# Altium footprint library Pcblib.PcbLib: 281 footprints (part 11 of 18)
Each footprint in its own frame and in the unit in brackets; x right, y up, seen from the top. Pads: shape width x height; smd on the part's side, far side on the other; paste and mask are expansions set on the pad; w line width, h text height; cw(c..) or ccw(c..) is an arc to the next point about the centre after c.
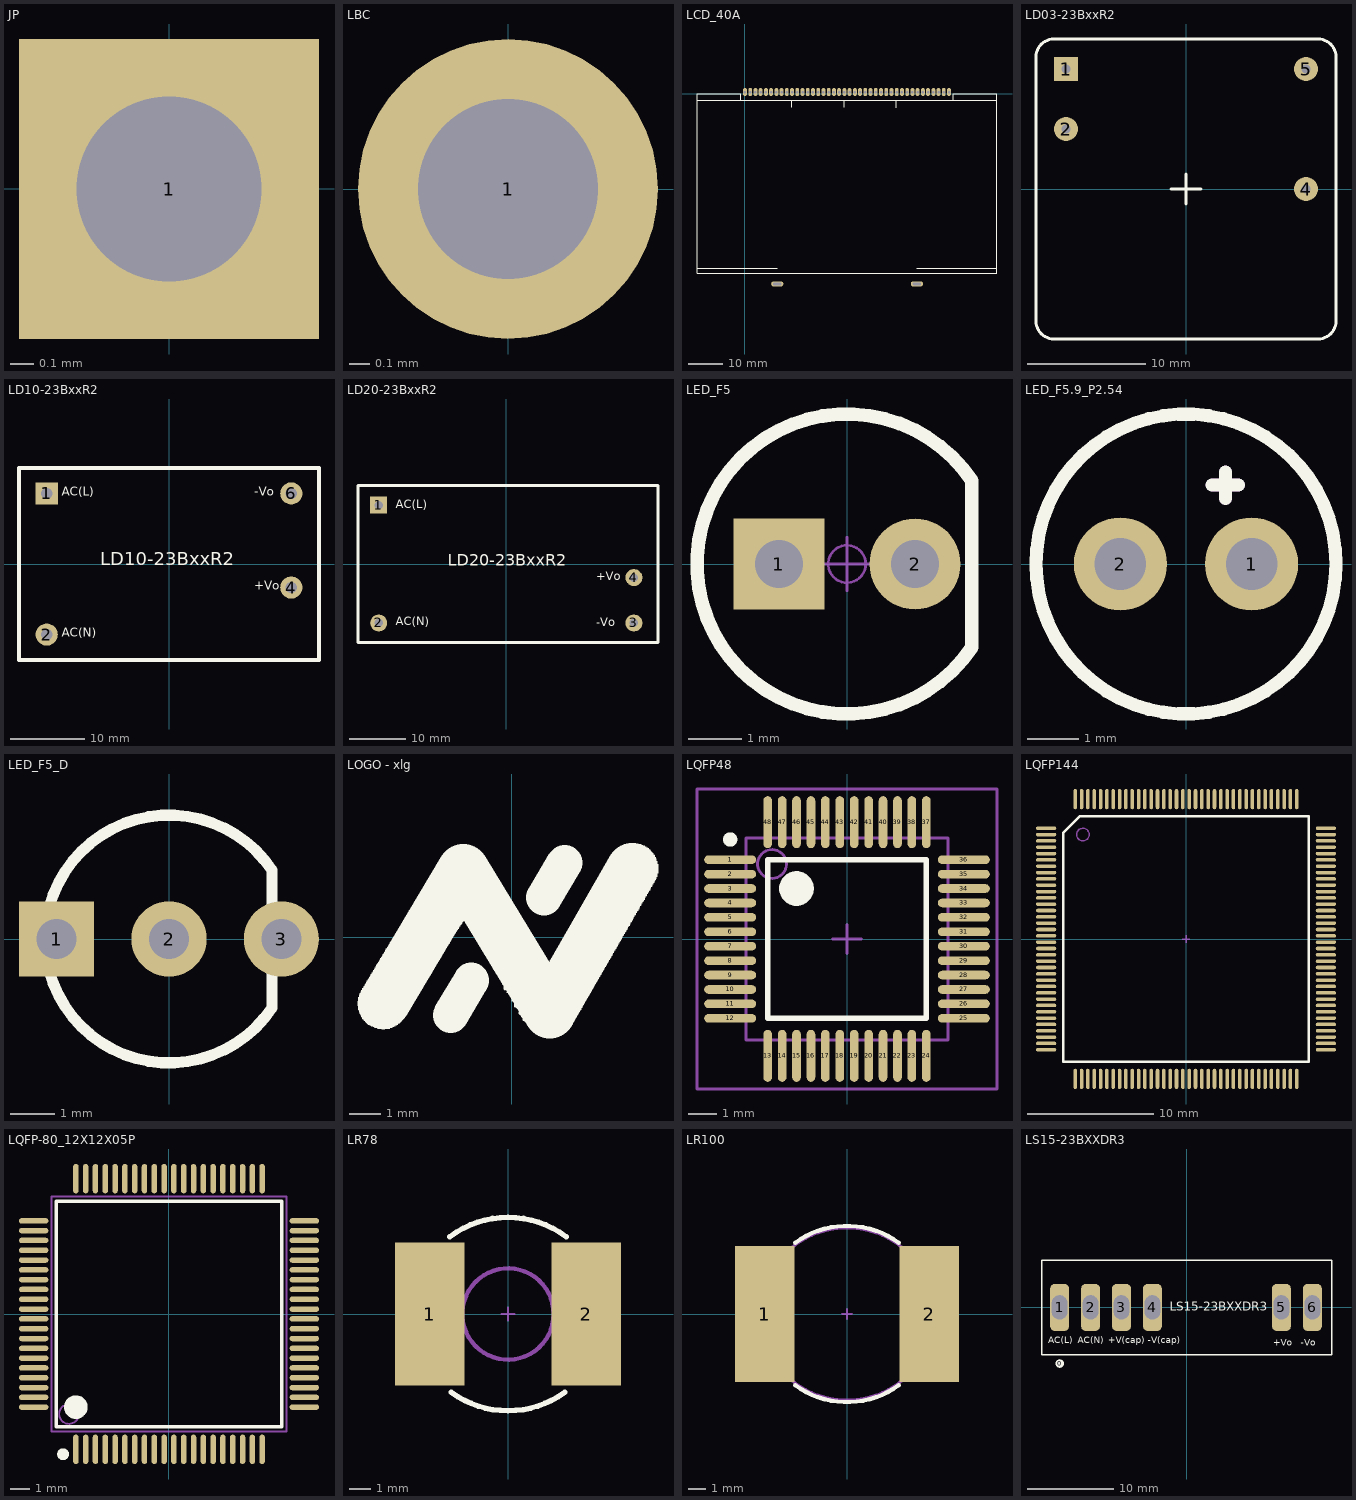
[diagram p10: the footprints below, top view; thin cyan lines are the x and y axes]

## JP [mm]
height 1.27
pads (1):
  rect 1.3x1.3 hole 0.8: 1(0,0)

## LBC [mm] "NMS"
pads (1):
  round 1.5 hole 0.9: 1(0,0)

## LCD_40A [mm]
height 5.6
pads (42):
  oval 1.1x2.3 hole 0.72: 1(0,0.5) 2(1.5,0.5) 3(3,0.5) 4(4.5,0.5) 5(6,0.5) 6(7.5,0.5) 7(9,0.5) 8(10.5,0.5) 9(12,0.5) 10(13.5,0.5) 11(15,0.5) 12(16.5,0.5) 13(18,0.5) 14(19.5,0.5) 15(21,0.5) 16(22.5,0.5) 17(24,0.5) 18(25.5,0.5) 19(27,0.5) 20(28.5,0.5) 21(30,0.5) 22(31.5,0.5) 23(33,0.5) 24(34.5,0.5) 25(36,0.5) 26(37.5,0.5) 27(39,0.5) 28(40.5,0.5) 29(42,0.5) 30(43.5,0.5) 31(45,0.5) 32(46.5,0.5) 33(48,0.5) 34(49.5,0.5) 35(51,0.5) 36(52.5,0.5) 37(54,0.5) 38(55.5,0.5) 39(57,0.5) 40(58.5,0.5)
  oval 3.5x1.5 hole 0.762 slot 2.3 at 0 deg: 41(49.276,-54.5) 42(9.271,-54.5)
Top Overlay:
  lines w0.254: -13.75,-50 9.25,-50 ; -13.75,-1.905 72.25,-1.905 ; -1.27,-1.905 -1.27,0 -13.75,0 -13.75,-51.5 72.25,-51.5 72.25,0 59.77,0 59.77,-1.905 ; 13.462,-3.81 13.462,-1.905 ; 28.448,-3.81 28.448,-1.905 ; 43.434,-3.937 43.434,-2.032 ; 49.25,-50 72.25,-50

## LD03-23BxxR2 [mil]
pads (4):
  rect 80x80 hole 30: 1(-400,400)
  round 80 hole 30: 2(-400,200) 4(400,0) 5(400,400)
Top Overlay:
  lines w10: -50,0 50,0 ; 0,-50 0,50 ; -500,-440 ccw(c-440,-440) -440,-500 440,-500 ccw(c440,-440) 500,-440 500,440 ccw(c440,440) 440,500 -440,500 ccw(c-440,440) -500,440 -500,-440
3D body "LD03-23BxxR2.stp": height 696.85, standoff -161.42, extent -500,-500 500,500

## LD10-23BxxR2 [mm]
pads (4):
  rect 3x3 hole 1.5: 1(-16.51,9.525)
  round 3 hole 1.5: 2(-16.51,-9.525) 4(16.51,-3.175) 6(16.51,9.525)
Top Overlay:
  lines w0.5: -20.25,-12.95 20.25,-12.95 20.25,12.95 -20.25,12.95 -20.25,-12.95
  text "-Vo" at 11.51,8.827 h2
  text "+Vo" at 11.51,-3.873 h2
  text "AC(L)" at -14.51,8.819 h2
  text "AC(N)" at -14.51,-10.231 h2
  text "LD10-23BxxR2" at -9.271,-0.762 h3

## LD20-23BxxR2 [mm]
pads (4):
  rect 3x3 hole 1.5: 1(-22.5,10.4)
  round 3 hole 1.5: 2(-22.5,-10.4) 3(22.5,-10.4) 4(22.5,-2.4)
Top Overlay:
  lines w0.5: -26.15,-13.85 -26.15,13.85 26.75,13.85 26.75,-13.85 -26.15,-13.85
  text "LD20-23BxxR2" at -10.308,-1.03 h3.5
  text "AC(L)" at -19.537,9.285 h2.5
  text "AC(N)" at -19.537,-11.289 h2.5
  text "-Vo" at 15.896,-11.502 h2.5
  text "+Vo" at 15.896,-3.415 h2.5

## LED_F5 [mm] "绿色5mm直插LED"
height 10.16
pads (2):
  rect 1.7x1.7 hole 0.9: 1(-1.27,0)
  round 1.7 hole 0.9: 2(1.27,0)
Top Overlay:
  lines w0.254: 2.33,-1.553 cw(c0,0) 2.33,1.553 2.33,-1.553
Mechanical 15:
  circle w0.05: c0,0 r0.35
  lines w0.05: -0.5,0 0.5,0 ; 0,-0.5 0,0.5
3D body "LED 5mm-G.STEP": height 4.5, standoff -3.45, extent -1.983,-0.795 2.076,0.805
3D body "LED 5mm玻璃罩.STEP": height 8.75, standoff 0.05, extent -2.85,-2.85 2.454,2.85

## LED_F5.9_P2.54 [mm]
pads (2):
  round 1.8 hole 1: 1(1.27,0) 2(-1.27,0)
Top Overlay:
  circle w0.254: c0,0 r2.9
  lines w0.254: 0.508,1.524 1.016,1.524 ; 0.762,1.27 0.762,1.778
Mechanical 5:
  circle w0.35: c1.27,0 r0.175
  circle w0.35: c-1.27,0 r0.175
Mechanical 15:
  lines w0.254: 0.508,1.524 1.016,1.524 ; 0.762,1.27 0.762,1.778

## LED_F5_D [mm] "绿色5mm直插LED"
height 10.16
pads (3):
  rect 1.7x1.7 hole 0.9: 1(-2.54,0)
  round 1.7 hole 0.9: 2(0,0) 3(2.54,0)
Top Overlay:
  lines w0.254: 2.33,-1.553 cw(c0,0) 2.33,1.553 2.33,-1.553
Mechanical 15:
  lines w0.05: -0.5,0 0.5,0 ; 0,-0.5 0,0.5
3D body "LED 5mm-G.STEP": height 4.5, standoff -3.45, extent -1.983,-0.795 2.076,0.805
3D body "LED 5mm玻璃罩.STEP": height 8.75, standoff 0.05, extent -2.85,-2.85 2.454,2.85

## LOGO - xlg [mm]
height 5.6
Top Overlay:
  drawing of 867 lines, arcs and shapes, not listed

## LQFP48 [mm]
pads (48):
  oval 1.8x0.3 smd: 1(-4.05,2.75) 2(-4.05,2.25) 3(-4.05,1.75) 4(-4.05,1.25) 5(-4.05,0.75) 6(-4.05,0.25) 7(-4.05,-0.25) 8(-4.05,-0.75) 9(-4.05,-1.25) 10(-4.05,-1.75) 11(-4.05,-2.25) 12(-4.05,-2.75) 25(4.05,-2.75) 26(4.05,-2.25) 27(4.05,-1.75) 28(4.05,-1.25) 29(4.05,-0.75) 30(4.05,-0.25) 31(4.05,0.25) 32(4.05,0.75) 33(4.05,1.25) 34(4.05,1.75) 35(4.05,2.25) 36(4.05,2.75)
  oval 0.3x1.8 smd: 13(-2.75,-4.05) 14(-2.25,-4.05) 15(-1.75,-4.05) 16(-1.25,-4.05) 17(-0.75,-4.05) 18(-0.25,-4.05) 19(0.25,-4.05) 20(0.75,-4.05) 21(1.25,-4.05) 22(1.75,-4.05) 23(2.25,-4.05) 24(2.75,-4.05) 37(2.75,4.05) 38(2.25,4.05) 39(1.75,4.05) 40(1.25,4.05) 41(0.75,4.05) 42(0.25,4.05) 43(-0.25,4.05) 44(-0.75,4.05) 45(-1.25,4.05) 46(-1.75,4.05) 47(-2.25,4.05) 48(-2.75,4.05)
Top Overlay:
  circle w0.25: c-4.05,3.45 r0.125
  circle w0.6: c-1.75,1.75 r0.3
  lines w0.2: -2.75,-2.75 -2.75,2.75 2.75,2.75 2.75,-2.75 -2.75,-2.75
Mechanical 13:
  circle w0.1: c-2.6,2.6 r0.5
  lines w0.1: -3.5,-3.5 -3.5,3.5 3.5,3.5 3.5,-3.5 -3.5,-3.5
Mechanical 15:
  lines w0.1: -0.5,0 0.5,0 ; 0,-0.5 0,0.5 ; -5.2,-5.2 -5.2,5.2 5.2,5.2 5.2,-5.2 -5.2,-5.2
3D body: height 1.56, standoff 0, extent -4.5,-4.496 4.5,4.504

## LQFP144 [mm]
pads (144):
  oval 1.6x0.28 smd: 1(-11.05,8.75) 2(-11.05,8.25) 3(-11.05,7.75) 4(-11.05,7.25) 5(-11.05,6.75) 6(-11.05,6.25) 7(-11.05,5.75) 8(-11.05,5.25) 9(-11.05,4.75) 10(-11.05,4.25) 11(-11.05,3.75) 12(-11.05,3.25) 13(-11.05,2.75) 14(-11.05,2.25) 15(-11.05,1.75) 16(-11.05,1.25) 17(-11.05,0.75) 18(-11.05,0.25) 19(-11.05,-0.25) 20(-11.05,-0.75) 21(-11.05,-1.25) 22(-11.05,-1.75) 23(-11.05,-2.25) 24(-11.05,-2.75) 25(-11.05,-3.25) 26(-11.05,-3.75) 27(-11.05,-4.25) 28(-11.05,-4.75) 29(-11.05,-5.25) 30(-11.05,-5.75) 31(-11.05,-6.25) 32(-11.05,-6.75) 33(-11.05,-7.25) 34(-11.05,-7.75) 35(-11.05,-8.25) 36(-11.05,-8.75) 73(11.05,-8.75) 74(11.05,-8.25) 75(11.05,-7.75) 76(11.05,-7.25) 77(11.05,-6.75) 78(11.05,-6.25) 79(11.05,-5.75) 80(11.05,-5.25) 81(11.05,-4.75) 82(11.05,-4.25) 83(11.05,-3.75) 84(11.05,-3.25) 85(11.05,-2.75) 86(11.05,-2.25) 87(11.05,-1.75) 88(11.05,-1.25) 89(11.05,-0.75) 90(11.05,-0.25) 91(11.05,0.25) 92(11.05,0.75) 93(11.05,1.25) 94(11.05,1.75) 95(11.05,2.25) 96(11.05,2.75) 97(11.05,3.25) 98(11.05,3.75) 99(11.05,4.25) 100(11.05,4.75) 101(11.05,5.25) 102(11.05,5.75) 103(11.05,6.25) 104(11.05,6.75) 105(11.05,7.25) 106(11.05,7.75) 107(11.05,8.25) 108(11.05,8.75)
  oval 0.28x1.6 smd: 37(-8.75,-11.05) 38(-8.25,-11.05) 39(-7.75,-11.05) 40(-7.25,-11.05) 41(-6.75,-11.05) 42(-6.25,-11.05) 43(-5.75,-11.05) 44(-5.25,-11.05) 45(-4.75,-11.05) 46(-4.25,-11.05) 47(-3.75,-11.05) 48(-3.25,-11.05) 49(-2.75,-11.05) 50(-2.25,-11.05) 51(-1.75,-11.05) 52(-1.25,-11.05) 53(-0.75,-11.05) 54(-0.25,-11.05) 55(0.25,-11.05) 56(0.75,-11.05) 57(1.25,-11.05) 58(1.75,-11.05) 59(2.25,-11.05) 60(2.75,-11.05) 61(3.25,-11.05) 62(3.75,-11.05) 63(4.25,-11.05) 64(4.75,-11.05) 65(5.25,-11.05) 66(5.75,-11.05) 67(6.25,-11.05) 68(6.75,-11.05) 69(7.25,-11.05) 70(7.75,-11.05) 71(8.25,-11.05) 72(8.75,-11.05) 109(8.75,11.05) 110(8.25,11.05) 111(7.75,11.05) 112(7.25,11.05) 113(6.75,11.05) 114(6.25,11.05) 115(5.75,11.05) 116(5.25,11.05) 117(4.75,11.05) 118(4.25,11.05) 119(3.75,11.05) 120(3.25,11.05) 121(2.75,11.05) 122(2.25,11.05) 123(1.75,11.05) 124(1.25,11.05) 125(0.75,11.05) 126(0.25,11.05) 127(-0.25,11.05) 128(-0.75,11.05) 129(-1.25,11.05) 130(-1.75,11.05) 131(-2.25,11.05) 132(-2.75,11.05) 133(-3.25,11.05) 134(-3.75,11.05) 135(-4.25,11.05) 136(-4.75,11.05) 137(-5.25,11.05) 138(-5.75,11.05) 139(-6.25,11.05) 140(-6.75,11.05) 141(-7.25,11.05) 142(-7.75,11.05) 143(-8.25,11.05) 144(-8.75,11.05)
Top Overlay:
  lines w0.2: -9.715,-9.715 9.715,-9.715 9.715,9.715 -8.38,9.715 -9.715,8.38 -9.715,-9.715
Mechanical 13:
  circle w0.1: c-8.146,8.251 r0.5
  lines w0.1: -9.704,-9.707 9.702,-9.707 9.702,9.724 -8.358,9.724 -9.704,8.378 -9.704,-9.707
Mechanical 15:
  lines w0.1: -0.295,0 0.305,0 ; 0,-0.305 0,0.295
3D body: height 0.53, standoff 0.02, extent -9.602,-9.605 9.6,9.597
3D body: height 1.35, standoff 0, extent -9.704,-9.707 9.702,9.724

## LQFP-80_12X12X05P [mm]
pads (80):
  oval 0.28x1.5 smd: 1(-4.75,-6.9) 2(-4.25,-6.9) 3(-3.75,-6.9) 4(-3.25,-6.9) 5(-2.75,-6.9) 6(-2.25,-6.9) 7(-1.75,-6.9) 8(-1.25,-6.9) 9(-0.75,-6.9) 10(-0.25,-6.9) 11(0.25,-6.9) 12(0.75,-6.9) 13(1.25,-6.9) 14(1.75,-6.9) 15(2.25,-6.9) 16(2.75,-6.9) 17(3.25,-6.9) 18(3.75,-6.9) 19(4.25,-6.9) 20(4.75,-6.9) 41(4.75,6.9) 42(4.25,6.9) 43(3.75,6.9) 44(3.25,6.9) 45(2.75,6.9) 46(2.25,6.9) 47(1.75,6.9) 48(1.25,6.9) 49(0.75,6.9) 50(0.25,6.9) 51(-0.25,6.9) 52(-0.75,6.9) 53(-1.25,6.9) 54(-1.75,6.9) 55(-2.25,6.9) 56(-2.75,6.9) 57(-3.25,6.9) 58(-3.75,6.9) 59(-4.25,6.9) 60(-4.75,6.9)
  oval 1.5x0.28 smd: 21(6.9,-4.75) 22(6.9,-4.25) 23(6.9,-3.75) 24(6.9,-3.25) 25(6.9,-2.75) 26(6.9,-2.25) 27(6.9,-1.75) 28(6.9,-1.25) 29(6.9,-0.75) 30(6.9,-0.25) 31(6.9,0.25) 32(6.9,0.75) 33(6.9,1.25) 34(6.9,1.75) 35(6.9,2.25) 36(6.9,2.75) 37(6.9,3.25) 38(6.9,3.75) 39(6.9,4.25) 40(6.9,4.75) 61(-6.9,4.75) 62(-6.9,4.25) 63(-6.9,3.75) 64(-6.9,3.25) 65(-6.9,2.75) 66(-6.9,2.25) 67(-6.9,1.75) 68(-6.9,1.25) 69(-6.9,0.75) 70(-6.9,0.25) 71(-6.9,-0.25) 72(-6.9,-0.75) 73(-6.9,-1.25) 74(-6.9,-1.75) 75(-6.9,-2.25) 76(-6.9,-2.75) 77(-6.9,-3.25) 78(-6.9,-3.75) 79(-6.9,-4.25) 80(-6.9,-4.75)
Top Overlay:
  circle w0.6: c-4.75,-4.75 r0.3
  circle w0.3: c-5.4,-7.15 r0.15
  lines w0.2: -5.75,-5.75 5.75,-5.75 5.75,5.75 -5.75,5.75 -5.75,-5.75
Mechanical 13:
  circle w0.1: c-5.1,-5.1 r0.5
  lines w0.1: -6,-6 6,-6 6,6 -6,6 -6,-6

## LR78 [mm]
height 2.8
pads (2):
  rect 3.2x6.6 smd: 1(-3.6,0) 2(3.6,0)
Top Overlay:
  lines w0.254: -2.67,3.56 cw(c0,0) 2.67,3.56 ; -2.61,-3.604 ccw(c0,0) 2.61,-3.604
Mechanical 13:
  circle w0.2: c0,0 r2.1
Mechanical 15:
  lines w0.1: -0.295,0 0.305,0 ; 0,-0.305 0,0.295
3D body: height 0.53, standoff 0.02, extent -3.175,-3.556 3.175,3.683

## LR100 [mm]
height 5.8
pads (2):
  rect 3.5x8 smd: 1(-4.85,0) 2(4.85,0)
Top Overlay:
  lines w0.254: -3.058,-4.205 ccw(c0,0) 3.058,-4.205 ; -3.058,4.205 cw(c0,0) 3.058,4.205
Mechanical 13:
  circle w0.2: c0,0 r5.1
Mechanical 15:
  lines w0.1: -0.295,0 0.305,0 ; 0,-0.305 0,0.295
3D body: height 0.53, standoff 0.02, extent -4.191,-4.064 4.191,4.191

## LS15-23BXXDR3 [mm]
height 21.5
pads (7):
  round 1 on Top Overlay mask+0.07: 0(-14.786,-6.529)
  rrect50% 2.2x5.5 hole 1.8 slot 2.8 at 90 deg: 1(-14.801,0) 2(-11.201,0) 3(-7.601,0) 4(-4.001,0) 5(11.02,0) 6(14.62,0)
Top Overlay:
  lines w0.2: -16.87,-5.5 16.87,-5.5 16.87,5.5 -16.87,5.5 -16.87,-5.5
  text "-Vo" at 13.245,-4.449 h0.76
  text "+Vo" at 10.07,-4.449 h0.76
  text "+V(cap)" at -9.126,-4.195 h0.76
  text "-V(cap)" at -4.554,-4.195 h0.76
  text "AC(N)" at -12.682,-4.195 h0.76
  text "AC(L)" at -16.111,-4.195 h0.76
  text "LS15-23BXXDR3" at -1.995,-0.368 h1
3D body "LS15-23BxxDR3.stp": height 21.65, standoff -3.18, extent -16.671,-4.86 16.669,4.86